# Altium footprint library Connector_art.PcbLib: 209 footprints (part 2 of 14)
Each footprint in its own frame and in the unit in brackets; x right, y up, seen from the top. Pads: shape width x height; smd on the part's side, far side on the other; paste and mask are expansions set on the pad; w line width, h text height; cw(c..) or ccw(c..) is an arc to the next point about the centre after c.
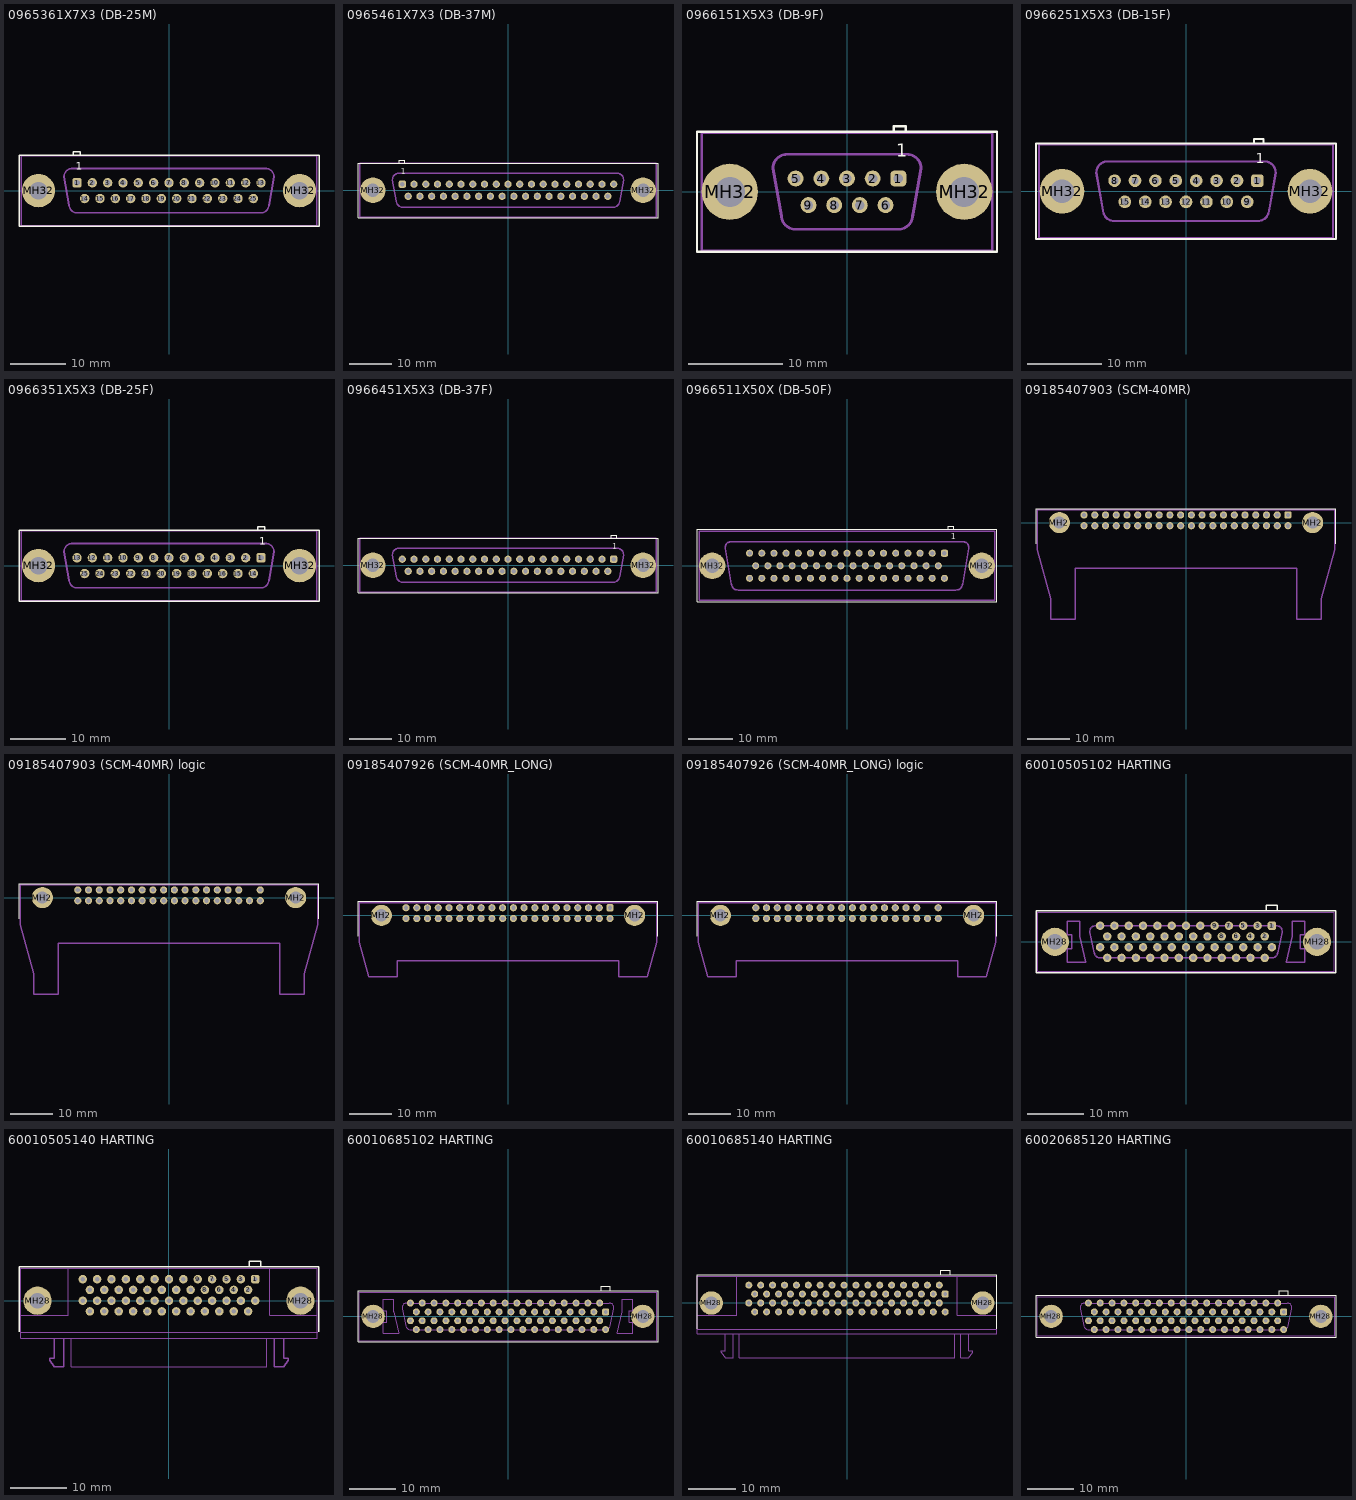
[diagram p1: the footprints below, top view; thin cyan lines are the x and y axes]

## 0965361X7X3 (DB-25M) [mm]
pads (27):
  rrect50% 1.7x1.7 hole 1: 1(-16.56,1.42)
  round 1.7 hole 1: 2(-13.8,1.42) 3(-11.04,1.42) 4(-8.28,1.42) 5(-5.52,1.42) 6(-2.76,1.42) 7(0,1.42) 8(2.76,1.42) 9(5.52,1.42) 10(8.28,1.42) 11(11.04,1.42) 12(13.8,1.42) 13(16.56,1.42) 14(-15.18,-1.42) 15(-12.42,-1.42) 16(-9.66,-1.42) 17(-6.9,-1.42) 18(-4.14,-1.42) 19(-1.38,-1.42) 20(1.38,-1.42) 21(4.14,-1.42) 22(6.9,-1.42) 23(9.66,-1.42) 24(12.42,-1.42) 25(15.18,-1.42)
  round 6 hole 3.2: MH32(-23.5,0) MH32(23.5,0)
Top Overlay:
  lines w0.25: -17.25,6.4 -17.25,7 -16,7 -16,6.4 ; -27,-6.4 -27,6.4 27,6.4 27,-6.4 -27,-6.4
  text "1" at -16.75,3.75 h1.38
Mechanical 1:
  circle w0.3: c-1.38,-1.42 r0.5
  circle w0.3: c1.38,-1.42 r0.5
  circle w0.3: c0,1.42 r0.5
  circle w0.3: c-23.5,0 r1.5
  circle w0.3: c23.5,0 r1.5
  circle w0.3: c4.14,-1.42 r0.5
  circle w0.3: c6.9,-1.42 r0.5
  circle w0.3: c9.66,-1.42 r0.5
  circle w0.3: c12.42,-1.42 r0.5
  circle w0.3: c15.18,-1.42 r0.5
  circle w0.3: c-4.14,-1.42 r0.5
  circle w0.3: c-6.9,-1.42 r0.5
  circle w0.3: c-9.66,-1.42 r0.5
  circle w0.3: c-12.42,-1.42 r0.5
  circle w0.3: c-15.18,-1.42 r0.5
  circle w0.3: c2.76,1.42 r0.5
  circle w0.3: c5.52,1.42 r0.5
  circle w0.3: c8.28,1.42 r0.5
  circle w0.3: c11.04,1.42 r0.5
  circle w0.3: c13.8,1.42 r0.5
  circle w0.3: c16.56,1.42 r0.5
  circle w0.3: c-2.76,1.42 r0.5
  circle w0.3: c-5.52,1.42 r0.5
  circle w0.3: c-8.28,1.42 r0.5
  circle w0.3: c-11.04,1.42 r0.5
  circle w0.3: c-13.8,1.42 r0.5
  circle w0.3: c-16.56,1.42 r0.5
  lines w0.1: -26,0 -21,0 ; -23.5,-2.5 -23.5,2.5 ; 21,0 26,0 ; 23.5,-2.5 23.5,2.5
  lines w0.3: -18,-2.6 -18.9,2.5 cw(c-17.4,2.5) -17.4,4 17.4,4 cw(c17.4,2.5) 18.9,2.5 18,-2.7 ; -18,-2.5 ccw(c-16.5,-2.5) -16.5,-4 16.5,-4 ccw(c16.5,-2.5) 18,-2.5 ; -26.6,-6.3 -26.6,6.3 26.6,6.3 26.6,-6.3 -26.6,-6.3
  text "13" at 16.75,2.25 h2.12
  text "1" at -18.25,2 h2.12
  text "25" at 15.75,-3.25 h2.12
  text "14" at -17.25,-3.25 h2.12

## 0965461X7X3 (DB-37M) [mm]
pads (39):
  rrect50% 1.7x1.7 hole 1: 1(-24.84,1.42)
  round 1.7 hole 1: 2(-22.08,1.42) 3(-19.32,1.42) 4(-16.56,1.42) 5(-13.8,1.42) 6(-11.04,1.42) 7(-8.28,1.42) 8(-5.52,1.42) 9(-2.76,1.42) 10(0,1.42) 11(2.76,1.42) 12(5.52,1.42) 13(8.28,1.42) 14(11.04,1.42) 15(13.8,1.42) 16(16.56,1.42) 17(19.32,1.42) 18(22.08,1.42) 19(24.84,1.42) 20(-23.46,-1.42) 21(-20.7,-1.42) 22(-17.94,-1.42) 23(-15.18,-1.42) 24(-12.42,-1.42) 25(-9.66,-1.42) 26(-6.9,-1.42) 27(-4.14,-1.42) 28(-1.38,-1.42) 29(1.38,-1.42) 30(4.14,-1.42) 31(6.9,-1.42) 32(9.66,-1.42) 33(12.42,-1.42) 34(15.18,-1.42) 35(17.94,-1.42) 36(20.7,-1.42) 37(23.46,-1.42)
  round 6 hole 3.2: MH32(-31.75,0) MH32(31.75,0)
Top Overlay:
  lines w0.25: -25.5,6.4 -25.5,7 -24.25,7 -24.25,6.4 ; -35.25,-6.4 -35.25,6.4 35.25,6.4 35.25,-6.4 -35.25,-6.4
  text "1" at -25.25,3.75 h1.38
Mechanical 1:
  circle w0.3: c-24.84,1.42 r0.5
  circle w0.3: c-22.08,1.42 r0.5
  circle w0.3: c-19.32,1.42 r0.5
  circle w0.3: c-16.56,1.42 r0.5
  circle w0.3: c-13.8,1.42 r0.5
  circle w0.3: c-11.04,1.42 r0.5
  circle w0.3: c-8.28,1.42 r0.5
  circle w0.3: c-5.52,1.42 r0.5
  circle w0.3: c-2.76,1.42 r0.5
  circle w0.3: c24.84,1.42 r0.5
  circle w0.3: c22.08,1.42 r0.5
  circle w0.3: c19.32,1.42 r0.5
  circle w0.3: c16.56,1.42 r0.5
  circle w0.3: c13.8,1.42 r0.5
  circle w0.3: c11.04,1.42 r0.5
  circle w0.3: c8.28,1.42 r0.5
  circle w0.3: c5.52,1.42 r0.5
  circle w0.3: c2.76,1.42 r0.5
  circle w0.3: c-23.46,-1.42 r0.5
  circle w0.3: c-20.7,-1.42 r0.5
  circle w0.3: c-17.94,-1.42 r0.5
  circle w0.3: c-15.18,-1.42 r0.5
  circle w0.3: c-12.42,-1.42 r0.5
  circle w0.3: c-9.66,-1.42 r0.5
  circle w0.3: c-6.9,-1.42 r0.5
  circle w0.3: c-4.14,-1.42 r0.5
  circle w0.3: c23.46,-1.42 r0.5
  circle w0.3: c20.7,-1.42 r0.5
  circle w0.3: c17.94,-1.42 r0.5
  circle w0.3: c15.18,-1.42 r0.5
  circle w0.3: c12.42,-1.42 r0.5
  circle w0.3: c9.66,-1.42 r0.5
  circle w0.3: c6.9,-1.42 r0.5
  circle w0.3: c4.14,-1.42 r0.5
  circle w0.3: c-1.38,-1.42 r0.5
  circle w0.3: c1.38,-1.42 r0.5
  circle w0.3: c0,1.42 r0.5
  circle w0.3: c-31.75,0 r1.5
  circle w0.3: c31.75,0 r1.5
  lines w0.1: -34.25,0 -29.25,0 ; -31.75,-2.5 -31.75,2.5 ; 29.25,0 34.25,0 ; 31.75,-2.5 31.75,2.5
  lines w0.3: -26.25,-2.6 -27.15,2.5 cw(c-25.65,2.5) -25.65,4 25.65,4 cw(c25.65,2.5) 27.15,2.5 26.25,-2.7 ; -26.25,-2.5 ccw(c-24.75,-2.5) -24.75,-4 24.75,-4 ccw(c24.75,-2.5) 26.25,-2.5 ; -34.85,-6.3 -34.85,6.3 34.85,6.3 34.85,-6.3 -34.85,-6.3
  text "19" at 25,2.25 h2.12
  text "1" at -26.25,2 h2.12
  text "37" at 24.25,-3.25 h2.12
  text "20" at -25.5,-3.25 h2.12

## 0966151X5X3 (DB-9F) [mm]
pads (11):
  rrect50% 1.7x1.7 hole 1: 1(5.48,1.42)
  round 1.7 hole 1: 2(2.74,1.42) 3(0,1.42) 4(-2.74,1.42) 5(-5.48,1.42) 6(4.11,-1.42) 7(1.37,-1.42) 8(-1.37,-1.42) 9(-4.11,-1.42)
  round 6 hole 3.2: MH32(-12.5,0) MH32(12.5,0)
Top Overlay:
  lines w0.25: 5,6.4 5,7 6.25,7 6.25,6.4 ; -16,-6.4 -16,6.4 16,6.4 16,-6.4 -16,-6.4
  text "1" at 5.25,3.75 h1.38
Mechanical 1:
  circle w0.3: c-5.48,1.42 r0.5
  circle w0.3: c-4.11,-1.42 r0.5
  circle w0.3: c-1.37,-1.42 r0.5
  circle w0.3: c-2.74,1.42 r0.5
  circle w0.3: c5.48,1.42 r0.5
  circle w0.3: c4.11,-1.42 r0.5
  circle w0.3: c2.74,1.42 r0.5
  circle w0.3: c1.37,-1.42 r0.5
  circle w0.3: c0,1.42 r0.5
  circle w0.3: c-12.5,0 r1.5
  circle w0.3: c12.5,0 r1.5
  lines w0.1: -15,0 -10,0 ; -12.5,-2.5 -12.5,2.5 ; 10,0 15,0 ; 12.5,-2.5 12.5,2.5
  lines w0.3: -7,-2.6 -7.9,2.5 cw(c-6.4,2.5) -6.4,4 6.4,4 cw(c6.4,2.5) 7.9,2.5 7,-2.7 ; -7,-2.5 ccw(c-5.5,-2.5) -5.5,-4 5.5,-4 ccw(c5.5,-2.5) 7,-2.5 ; -15.5,-6.3 -15.5,6.3 15.5,6.3 15.5,-6.3 -15.5,-6.3
  text "5" at -7.25,2 h2.12
  text "1" at 6.5,2 h2.12
  text "9" at -6.25,-3 h2.12
  text "6" at 5.25,-3 h2.12

## 0966251X5X3 (DB-15F) [mm]
pads (17):
  rrect50% 1.7x1.7 hole 1: 1(9.59,1.42)
  round 1.7 hole 1: 2(6.85,1.42) 3(4.11,1.42) 4(1.37,1.42) 5(-1.37,1.42) 6(-4.11,1.42) 7(-6.85,1.42) 8(-9.59,1.42) 9(8.22,-1.42) 10(5.48,-1.42) 11(2.74,-1.42) 12(0,-1.42) 13(-2.74,-1.42) 14(-5.48,-1.42) 15(-8.22,-1.42)
  round 6 hole 3.2: MH32(-16.65,0) MH32(16.65,0)
Top Overlay:
  lines w0.25: 9.15,6.4 9.15,7 10.4,7 10.4,6.4 ; -20.15,-6.4 -20.15,6.4 20.15,6.4 20.15,-6.4 -20.15,-6.4
  text "1" at 9.4,3.75 h1.38
Mechanical 1:
  circle w0.3: c-1.37,1.42 r0.5
  circle w0.3: c1.37,1.42 r0.5
  circle w0.3: c0,-1.42 r0.5
  circle w0.3: c-16.65,0 r1.5
  circle w0.3: c16.65,0 r1.5
  circle w0.3: c4.11,1.42 r0.5
  circle w0.3: c6.85,1.42 r0.5
  circle w0.3: c9.59,1.42 r0.5
  circle w0.3: c-4.11,1.42 r0.5
  circle w0.3: c-6.85,1.42 r0.5
  circle w0.3: c-9.59,1.42 r0.5
  circle w0.3: c2.74,-1.42 r0.5
  circle w0.3: c5.48,-1.42 r0.5
  circle w0.3: c8.22,-1.42 r0.5
  circle w0.3: c-2.74,-1.42 r0.5
  circle w0.3: c-5.48,-1.42 r0.5
  circle w0.3: c-8.22,-1.42 r0.5
  lines w0.1: -19.15,0 -14.15,0 ; -16.65,-2.5 -16.65,2.5 ; 14.15,0 19.15,0 ; 16.65,-2.5 16.65,2.5
  lines w0.3: -11.15,-2.6 -12.05,2.5 cw(c-10.55,2.5) -10.55,4 10.55,4 cw(c10.55,2.5) 12.05,2.5 11.15,-2.7 ; -11.15,-2.5 ccw(c-9.65,-2.5) -9.65,-4 9.65,-4 ccw(c9.65,-2.5) 11.15,-2.5 ; -19.75,-6.3 -19.75,6.3 19.75,6.3 19.75,-6.3 -19.75,-6.3
  text "8" at -11.4,2 h2.12
  text "1" at 10.65,2 h2.12
  text "15" at -10.4,-3 h2.12
  text "9" at 9.4,-3 h2.12

## 0966351X5X3 (DB-25F) [mm]
pads (27):
  rrect50% 1.7x1.7 hole 1: 1(16.56,1.42)
  round 1.7 hole 1: 2(13.8,1.42) 3(11.04,1.42) 4(8.28,1.42) 5(5.52,1.42) 6(2.76,1.42) 7(0,1.42) 8(-2.76,1.42) 9(-5.52,1.42) 10(-8.28,1.42) 11(-11.04,1.42) 12(-13.8,1.42) 13(-16.56,1.42) 14(15.18,-1.42) 15(12.42,-1.42) 16(9.66,-1.42) 17(6.9,-1.42) 18(4.14,-1.42) 19(1.38,-1.42) 20(-1.38,-1.42) 21(-4.14,-1.42) 22(-6.9,-1.42) 23(-9.66,-1.42) 24(-12.42,-1.42) 25(-15.18,-1.42)
  round 6 hole 3.2: MH32(-23.5,0) MH32(23.5,0)
Top Overlay:
  lines w0.25: 16,6.4 16,7 17.25,7 17.25,6.4 ; -27,-6.4 -27,6.4 27,6.4 27,-6.4 -27,-6.4
  text "1" at 16.25,3.75 h1.38
Mechanical 1:
  circle w0.3: c-1.38,-1.42 r0.5
  circle w0.3: c1.38,-1.42 r0.5
  circle w0.3: c0,1.42 r0.5
  circle w0.3: c-23.5,0 r1.5
  circle w0.3: c23.5,0 r1.5
  circle w0.3: c4.14,-1.42 r0.5
  circle w0.3: c6.9,-1.42 r0.5
  circle w0.3: c9.66,-1.42 r0.5
  circle w0.3: c12.42,-1.42 r0.5
  circle w0.3: c15.18,-1.42 r0.5
  circle w0.3: c-4.14,-1.42 r0.5
  circle w0.3: c-6.9,-1.42 r0.5
  circle w0.3: c-9.66,-1.42 r0.5
  circle w0.3: c-12.42,-1.42 r0.5
  circle w0.3: c-15.18,-1.42 r0.5
  circle w0.3: c2.76,1.42 r0.5
  circle w0.3: c5.52,1.42 r0.5
  circle w0.3: c8.28,1.42 r0.5
  circle w0.3: c11.04,1.42 r0.5
  circle w0.3: c13.8,1.42 r0.5
  circle w0.3: c16.56,1.42 r0.5
  circle w0.3: c-2.76,1.42 r0.5
  circle w0.3: c-5.52,1.42 r0.5
  circle w0.3: c-8.28,1.42 r0.5
  circle w0.3: c-11.04,1.42 r0.5
  circle w0.3: c-13.8,1.42 r0.5
  circle w0.3: c-16.56,1.42 r0.5
  lines w0.1: -26,0 -21,0 ; -23.5,-2.5 -23.5,2.5 ; 21,0 26,0 ; 23.5,-2.5 23.5,2.5
  lines w0.3: -18,-2.6 -18.9,2.5 cw(c-17.4,2.5) -17.4,4 17.4,4 cw(c17.4,2.5) 18.9,2.5 18,-2.7 ; -18,-2.5 ccw(c-16.5,-2.5) -16.5,-4 16.5,-4 ccw(c16.5,-2.5) 18,-2.5 ; -26.6,-6.3 -26.6,6.3 26.6,6.3 26.6,-6.3 -26.6,-6.3
  text "13" at -18.25,2 h2.12
  text "1" at 17.5,2 h2.12
  text "25" at -17.25,-3 h2.12
  text "14" at 16,-3 h2.12

## 0966451X5X3 (DB-37F) [mm]
pads (39):
  rrect50% 1.7x1.7 hole 1: 1(24.84,1.42)
  round 1.7 hole 1: 2(22.08,1.42) 3(19.32,1.42) 4(16.56,1.42) 5(13.8,1.42) 6(11.04,1.42) 7(8.28,1.42) 8(5.52,1.42) 9(2.76,1.42) 10(0,1.42) 11(-2.76,1.42) 12(-5.52,1.42) 13(-8.28,1.42) 14(-11.04,1.42) 15(-13.8,1.42) 16(-16.56,1.42) 17(-19.32,1.42) 18(-22.08,1.42) 19(-24.84,1.42) 20(23.46,-1.42) 21(20.7,-1.42) 22(17.94,-1.42) 23(15.18,-1.42) 24(12.42,-1.42) 25(9.66,-1.42) 26(6.9,-1.42) 27(4.14,-1.42) 28(1.38,-1.42) 29(-1.38,-1.42) 30(-4.14,-1.42) 31(-6.9,-1.42) 32(-9.66,-1.42) 33(-12.42,-1.42) 34(-15.18,-1.42) 35(-17.94,-1.42) 36(-20.7,-1.42) 37(-23.46,-1.42)
  round 6 hole 3.2: MH32(-31.75,0) MH32(31.75,0)
Top Overlay:
  lines w0.25: 24.25,6.4 24.25,7 25.5,7 25.5,6.4 ; -35.25,-6.4 35.25,-6.4 35.25,6.4 -35.25,6.4 -35.25,-6.4
  text "1" at 24.5,3.75 h1.38
Mechanical 1:
  circle w0.3: c31.75,0 r1.5
  circle w0.3: c-31.75,0 r1.5
  circle w0.3: c0,1.42 r0.5
  circle w0.3: c1.38,-1.42 r0.5
  circle w0.3: c-1.38,-1.42 r0.5
  circle w0.3: c4.14,-1.42 r0.5
  circle w0.3: c6.9,-1.42 r0.5
  circle w0.3: c9.66,-1.42 r0.5
  circle w0.3: c12.42,-1.42 r0.5
  circle w0.3: c15.18,-1.42 r0.5
  circle w0.3: c17.94,-1.42 r0.5
  circle w0.3: c20.7,-1.42 r0.5
  circle w0.3: c23.46,-1.42 r0.5
  circle w0.3: c-4.14,-1.42 r0.5
  circle w0.3: c-6.9,-1.42 r0.5
  circle w0.3: c-9.66,-1.42 r0.5
  circle w0.3: c-12.42,-1.42 r0.5
  circle w0.3: c-15.18,-1.42 r0.5
  circle w0.3: c-17.94,-1.42 r0.5
  circle w0.3: c-20.7,-1.42 r0.5
  circle w0.3: c-23.46,-1.42 r0.5
  circle w0.3: c2.76,1.42 r0.5
  circle w0.3: c5.52,1.42 r0.5
  circle w0.3: c8.28,1.42 r0.5
  circle w0.3: c11.04,1.42 r0.5
  circle w0.3: c13.8,1.42 r0.5
  circle w0.3: c16.56,1.42 r0.5
  circle w0.3: c19.32,1.42 r0.5
  circle w0.3: c22.08,1.42 r0.5
  circle w0.3: c24.84,1.42 r0.5
  circle w0.3: c-2.76,1.42 r0.5
  circle w0.3: c-5.52,1.42 r0.5
  circle w0.3: c-8.28,1.42 r0.5
  circle w0.3: c-11.04,1.42 r0.5
  circle w0.3: c-13.8,1.42 r0.5
  circle w0.3: c-16.56,1.42 r0.5
  circle w0.3: c-19.32,1.42 r0.5
  circle w0.3: c-22.08,1.42 r0.5
  circle w0.3: c-24.84,1.42 r0.5
  lines w0.1: -34.25,0 -29.25,0 ; -31.75,-2.5 -31.75,2.5 ; 29.25,0 34.25,0 ; 31.75,-2.5 31.75,2.5
  lines w0.3: -26.25,-2.6 -27.15,2.5 cw(c-25.65,2.5) -25.65,4 25.65,4 cw(c25.65,2.5) 27.15,2.5 26.25,-2.7 ; -26.25,-2.5 ccw(c-24.75,-2.5) -24.75,-4 24.75,-4 ccw(c24.75,-2.5) 26.25,-2.5 ; -34.85,-6.3 34.85,-6.3 34.85,6.3 -34.85,6.3 -34.85,-6.3
  text "20" at 24.25,-3 h2.12
  text "37" at -25.5,-3 h2.12
  text "1" at 25.75,2 h2.12
  text "19" at -26.5,2 h2.12

## 0966511X50X (DB-50F) [mm]
pads (52):
  rrect50% 1.6x1.6 hole 1: 1(22.08,2.84)
  round 1.6 hole 1: 2(19.32,2.84) 3(16.56,2.84) 4(13.8,2.84) 5(11.04,2.84) 6(8.28,2.84) 7(5.52,2.84) 8(2.76,2.84) 9(0,2.84) 10(-2.76,2.84) 11(-5.52,2.84) 12(-8.28,2.84) 13(-11.04,2.84) 14(-13.8,2.84) 15(-16.56,2.84) 16(-19.32,2.84) 17(-22.08,2.84) 18(20.7,0) 19(17.94,0) 20(15.18,0) 21(12.42,0) 22(9.66,0) 23(6.9,0) 24(4.14,0) 25(1.38,0) 26(-1.38,0) 27(-4.14,0) 28(-6.9,0) 29(-9.66,0) 30(-12.42,0) 31(-15.18,0) 32(-17.94,0) 33(-20.7,0) 34(22.08,-2.84) 35(19.32,-2.84) 36(16.56,-2.84) 37(13.8,-2.84) 38(11.04,-2.84) 39(8.28,-2.84) 40(5.52,-2.84) 41(2.76,-2.84) 42(0,-2.84) 43(-2.76,-2.84) 44(-5.52,-2.84) 45(-8.28,-2.84) 46(-11.04,-2.84) 47(-13.8,-2.84) 48(-16.56,-2.84) 49(-19.32,-2.84) 50(-22.08,-2.84)
  round 6 hole 3.2: MH32(-30.55,0) MH32(30.55,0)
Top Overlay:
  lines w0.25: 23,8.3 23,9 24.25,9 24.25,8.3 ; -34,-8.2 34,-8.2 34,8.3 -34,8.3 -34,-8.2
  text "1" at 23.5,6 h1.38
Mechanical 1:
  circle w0.3: c-22.08,-2.84 r0.5
  circle w0.3: c-22.08,2.84 r0.5
  circle w0.3: c-19.32,-2.84 r0.5
  circle w0.3: c-19.32,2.84 r0.5
  circle w0.3: c-16.56,-2.84 r0.5
  circle w0.3: c-16.56,2.84 r0.5
  circle w0.3: c-13.8,-2.84 r0.5
  circle w0.3: c-13.8,2.84 r0.5
  circle w0.3: c-11.04,-2.84 r0.5
  circle w0.3: c-11.04,2.84 r0.5
  circle w0.3: c-8.28,-2.84 r0.5
  circle w0.3: c-8.28,2.84 r0.5
  circle w0.3: c-5.52,-2.84 r0.5
  circle w0.3: c-5.52,2.84 r0.5
  circle w0.3: c-2.76,-2.84 r0.5
  circle w0.3: c-2.76,2.84 r0.5
  circle w0.3: c22.08,-2.84 r0.5
  circle w0.3: c22.08,2.84 r0.5
  circle w0.3: c19.32,-2.84 r0.5
  circle w0.3: c19.32,2.84 r0.5
  circle w0.3: c16.56,-2.84 r0.5
  circle w0.3: c16.56,2.84 r0.5
  circle w0.3: c13.8,-2.84 r0.5
  circle w0.3: c13.8,2.84 r0.5
  circle w0.3: c11.04,-2.84 r0.5
  circle w0.3: c11.04,2.84 r0.5
  circle w0.3: c8.28,-2.84 r0.5
  circle w0.3: c8.28,2.84 r0.5
  circle w0.3: c5.52,-2.84 r0.5
  circle w0.3: c5.52,2.84 r0.5
  circle w0.3: c2.76,-2.84 r0.5
  circle w0.3: c2.76,2.84 r0.5
  circle w0.3: c-20.7,0 r0.5
  circle w0.3: c-17.94,0 r0.5
  circle w0.3: c-15.18,0 r0.5
  circle w0.3: c-12.42,0 r0.5
  circle w0.3: c-9.66,0 r0.5
  circle w0.3: c-6.9,0 r0.5
  circle w0.3: c-4.14,0 r0.5
  circle w0.3: c20.7,0 r0.5
  circle w0.3: c17.94,0 r0.5
  circle w0.3: c15.18,0 r0.5
  circle w0.3: c12.42,0 r0.5
  circle w0.3: c9.66,0 r0.5
  circle w0.3: c6.9,0 r0.5
  circle w0.3: c4.14,0 r0.5
  circle w0.3: c0,2.84 r0.5
  circle w0.3: c1.38,0 r0.5
  circle w0.3: c-1.38,0 r0.5
  circle w0.3: c0,-2.84 r0.5
  circle w0.3: c-30.55,0 r1.5
  circle w0.3: c30.55,0 r1.5
  lines w0.1: -33.05,0 -28.05,0 ; -30.55,-2.5 -30.55,2.5 ; 28.05,0 33.05,0 ; 30.55,-2.5 30.55,2.5
  lines w0.3: -26.2,-4.2 -27.65,4 cw(c-26.15,4) -26.15,5.5 ; -26.2,5.5 26.2,5.5 ; -26.193,-4.149 ccw(c-24.7,-4) -24.7,-5.5 24.7,-5.5 ccw(c24.7,-4) 26.193,-4.149 ; 26.15,5.5 cw(c26.15,4) 27.65,4 26.2,-4.2 ; -33.5,-7.8 33.5,-7.8 33.5,7.8 -33.5,7.8 -33.5,-7.8
  text "18" at 22.25,-0.5 h2.12
  text "33" at -24,-0.75 h2.12
  text "34" at 23.75,-3.5 h2.12
  text "50" at -25.5,-3.5 h2.12
  text "1" at 23.75,2.25 h2.12
  text "17" at -25.25,2.25 h2.12
3D body: height 12.4, standoff -3.2, extent -33.5,-7.7 33.5,7.7

## 09185407903 (SCM-40MR) [mm]
height 9
pads (42):
  rrect50% 1.7x1.7 hole 1: 1(24.13,1.8)
  round 1.7 hole 1: 2(24.13,-0.74) 3(21.59,1.8) 4(21.61,-0.74) 5(19.05,1.8) 6(19.05,-0.74) 7(16.51,1.8) 8(16.51,-0.74) 9(13.97,1.8) 10(13.97,-0.74) 11(11.43,1.8) 12(11.43,-0.74) 13(8.89,1.8) 14(8.89,-0.74) 15(6.35,1.8) 16(6.35,-0.74) 17(3.81,1.8) 18(3.81,-0.74) 19(1.27,1.8) 20(1.27,-0.74) 21(-1.27,1.8) 22(-1.25,-0.74) 23(-3.81,1.8) 24(-3.81,-0.74) 25(-6.35,1.8) 26(-6.35,-0.74) 27(-8.89,1.8) 28(-8.89,-0.74) 29(-11.43,1.8) 30(-11.43,-0.74) 31(-13.97,1.8) 32(-13.95,-0.74) 33(-16.51,1.8) 34(-16.51,-0.74) 35(-19.05,1.8) 36(-19.05,-0.74) 37(-21.59,1.8) 38(-21.59,-0.74) 39(-24.13,1.8) 40(-24.13,-0.74)
  round 5 hole 2.9: MH2(-29.97,0) MH2(29.97,0)
Top Overlay:
  lines w0.25: -35.5,-5 -35.5,3.3 35.5,3.3 35.5,-5
Mechanical 1:
  lines w0.3: -35.208,-6.392 -32.05,-17.97 -32.05,-22.9 -26.2,-22.9 -26.2,-10.8 26.2,-10.8 26.2,-22.9 32.05,-22.9 32.05,-17.97 35.2,-6.42 35.2,3 -35.2,3 -35.2,-6.4
3D body: height 8.5, standoff -3.2, extent -35.197,-22.9 35.203,2.85

## 09185407903 (SCM-40MR) logic [mm]
height 9
pads (37):
  round 1.7 hole 1: 3(21.59,1.8) 4(21.61,-0.74) 6(19.05,-0.74) 7(16.51,1.8) 8(16.51,-0.74) 9(13.97,1.8) 10(13.97,-0.74) 11(11.43,1.8) 12(11.43,-0.74) 13(8.89,1.8) 14(8.89,-0.74) 15(6.35,1.8) 16(6.35,-0.74) 17(3.81,1.8) 18(3.81,-0.74) 19(1.27,1.8) 20(1.27,-0.74) 21(-1.27,1.8) 22(-1.25,-0.74) 23(-3.81,1.8) 24(-3.81,-0.74) 25(-6.35,1.8) 26(-6.35,-0.74) 27(-8.89,1.8) 28(-8.89,-0.74) 29(-11.43,1.8) 30(-11.43,-0.74) 31(-13.97,1.8) 32(-13.95,-0.74) 33(-16.51,1.8) 34(-16.51,-0.74) 35(-19.05,1.8) 36(-19.05,-0.74) 37(-21.59,1.8) 38(-21.59,-0.74)
  round 5 hole 2.9: MH2(-29.97,0) MH2(29.97,0)
Top Overlay:
  lines w0.25: -35.5,-5 -35.5,3.3 35.5,3.3 35.5,-5
Mechanical 1:
  lines w0.3: -35.208,-6.392 -32.05,-17.97 -32.05,-22.9 -26.2,-22.9 -26.2,-10.8 26.2,-10.8 26.2,-22.9 32.05,-22.9 32.05,-17.97 35.2,-6.42 35.2,3 -35.2,3 -35.2,-6.4
3D body: height 8.5, standoff -3.2, extent -35.197,-22.9 35.203,2.85

## 09185407926 (SCM-40MR_LONG) [mm]
height 9
pads (42):
  rrect50% 1.7x1.7 hole 1: 1(24.13,1.8)
  round 1.7 hole 1: 2(24.13,-0.74) 3(21.59,1.8) 4(21.61,-0.74) 5(19.05,1.8) 6(19.05,-0.74) 7(16.51,1.8) 8(16.51,-0.74) 9(13.97,1.8) 10(13.97,-0.74) 11(11.43,1.8) 12(11.43,-0.74) 13(8.89,1.8) 14(8.89,-0.74) 15(6.35,1.8) 16(6.35,-0.74) 17(3.81,1.8) 18(3.81,-0.74) 19(1.27,1.8) 20(1.27,-0.74) 21(-1.27,1.8) 22(-1.25,-0.74) 23(-3.81,1.8) 24(-3.81,-0.74) 25(-6.35,1.8) 26(-6.35,-0.74) 27(-8.89,1.8) 28(-8.89,-0.74) 29(-11.43,1.8) 30(-11.43,-0.74) 31(-13.97,1.8) 32(-13.95,-0.74) 33(-16.51,1.8) 34(-16.51,-0.74) 35(-19.05,1.8) 36(-19.05,-0.74) 37(-21.59,1.8) 38(-21.59,-0.74) 39(-24.13,1.8) 40(-24.13,-0.74)
  round 5 hole 2.9: MH2(-29.97,0) MH2(29.97,0)
Top Overlay:
  lines w0.25: -35.5,-5 -35.5,3.3 35.5,3.3 35.5,-5
Mechanical 1:
  lines w0.3: -35.208,-6.392 -32.996,-14.5 -26.2,-14.5 -26.2,-10.8 26.2,-10.8 26.2,-14.5 33,-14.5 ; -35.2,-6.4 -35.2,3 35.2,3 35.2,-6.42 32.997,-14.499
3D body: height 20.5, standoff -3, extent -35.197,-14.45 35.203,2.85

## 09185407926 (SCM-40MR_LONG) logic [mm]
height 9
pads (37):
  round 1.7 hole 1: 3(21.59,1.8) 4(21.61,-0.74) 6(19.05,-0.74) 7(16.51,1.8) 8(16.51,-0.74) 9(13.97,1.8) 10(13.97,-0.74) 11(11.43,1.8) 12(11.43,-0.74) 13(8.89,1.8) 14(8.89,-0.74) 15(6.35,1.8) 16(6.35,-0.74) 17(3.81,1.8) 18(3.81,-0.74) 19(1.27,1.8) 20(1.27,-0.74) 21(-1.27,1.8) 22(-1.25,-0.74) 23(-3.81,1.8) 24(-3.81,-0.74) 25(-6.35,1.8) 26(-6.35,-0.74) 27(-8.89,1.8) 28(-8.89,-0.74) 29(-11.43,1.8) 30(-11.43,-0.74) 31(-13.97,1.8) 32(-13.95,-0.74) 33(-16.51,1.8) 34(-16.51,-0.74) 35(-19.05,1.8) 36(-19.05,-0.74) 37(-21.59,1.8) 38(-21.59,-0.74)
  round 5 hole 2.9: MH2(-29.97,0) MH2(29.97,0)
Top Overlay:
  lines w0.25: -35.5,-5 -35.5,3.3 35.5,3.3 35.5,-5
Mechanical 1:
  lines w0.3: -35.208,-6.392 -32.996,-14.5 -26.2,-14.5 -26.2,-10.8 26.2,-10.8 26.2,-14.5 33,-14.5 ; -35.2,-6.4 -35.2,3 35.2,3 35.2,-6.42 32.997,-14.499
3D body: height 20.5, standoff -3, extent -35.197,-14.45 35.203,2.85

## 60010505102 HARTING [mm]
pads (52):
  rrect50% 1.5x1.5 hole 0.8: 1(15.24,2.85)
  round 1.5 hole 0.8: 2(13.97,0.95) 3(12.7,2.85) 4(11.43,0.95) 5(10.16,2.85) 6(8.89,0.95) 7(7.62,2.85) 8(6.35,0.95) 9(5.08,2.85) 10(3.81,0.95) 11(2.54,2.85) 12(1.27,0.95) 13(0,2.85) 14(-1.27,0.95) 15(-2.54,2.85) 16(-3.81,0.95) 17(-5.08,2.85) 18(-6.35,0.95) 19(-7.62,2.85) 20(-8.89,0.95) 21(-10.16,2.85) 22(-11.43,0.95) 23(-12.7,2.85) 24(-13.97,0.95) 25(-15.24,2.85) 26(15.24,-0.95) 27(13.97,-2.85) 28(12.7,-0.95) 29(11.43,-2.85) 30(10.16,-0.95) 31(8.89,-2.85) 32(7.62,-0.95) 33(6.35,-2.85) 34(5.08,-0.95) 35(3.81,-2.85) 36(2.54,-0.95) 37(1.27,-2.85) 38(0,-0.95) 39(-1.27,-2.85) 40(-2.54,-0.95) 41(-3.81,-2.85) 42(-5.08,-0.95) 43(-6.35,-2.85) 44(-7.62,-0.95) 45(-8.89,-2.85) 46(-10.16,-0.95) 47(-11.43,-2.85) 48(-12.7,-0.95) 49(-13.97,-2.85) 50(-15.24,-0.95)
  round 5 hole 2.8: MH28(-23.24,0) MH28(23.24,0)
Top Overlay:
  lines w0.25: 14.2,5.5 14.2,6.5 16.2,6.5 16.2,5.5 ; -26.6,-5.5 -26.6,5.5 26.6,5.5 26.6,-5.5 -26.6,-5.5
Mechanical 1:
  lines w0.2: -26.3,-5.2 -26.3,5.2 26.3,5.2 26.3,-5.2 -26.3,-5.2
  lines w0.25: -17.777,-3.667 -18.8,1 -18.8,3.65 -21.1,3.65 -21.1,1.25 -20.3,1.25 -20.3,-1.25 -21.1,-1.25 -21.1,-3.65 -17.777,-3.65 ; -17.042,1.675 -16.235,-2.005 ; -17.035,1.676 cw(c-16.05,1.85) -16.05,2.85 16.05,2.85 cw(c16.05,1.85) 17.035,1.676 ; -16.238,-2.006 ccw(c-15.25,-1.85) -15.25,-2.85 15.25,-2.85 ccw(c15.25,-1.85) 16.25,-1.85 ; 16.235,-2.008 17.042,1.675 ; 17.777,-3.667 18.8,1 18.8,3.65 21.1,3.65 21.1,1.25 20.3,1.25 20.3,-1.25 21.1,-1.25 21.1,-3.65 17.777,-3.65
3D body: height 9, standoff -3.3, extent -26.225,-5.25 26.225,5.25

## 60010505140 HARTING [mm]
pads (52):
  rrect50% 1.5x1.5 hole 0.8: 1(15.24,3.8)
  round 1.5 hole 0.8: 2(13.97,1.9) 3(12.7,3.8) 4(11.43,1.9) 5(10.16,3.8) 6(8.89,1.9) 7(7.62,3.8) 8(6.35,1.9) 9(5.08,3.8) 10(3.81,1.9) 11(2.54,3.8) 12(1.27,1.9) 13(0,3.8) 14(-1.27,1.9) 15(-2.54,3.8) 16(-3.81,1.9) 17(-5.08,3.8) 18(-6.35,1.9) 19(-7.62,3.8) 20(-8.89,1.9) 21(-10.16,3.8) 22(-11.43,1.9) 23(-12.7,3.8) 24(-13.97,1.9) 25(-15.24,3.8) 26(15.24,0) 27(13.97,-1.9) 28(12.7,0) 29(11.43,-1.9) 30(10.16,0) 31(8.89,-1.9) 32(7.62,0) 33(6.35,-1.9) 34(5.08,0) 35(3.81,-1.9) 36(2.54,0) 37(1.27,-1.9) 38(0,0) 39(-1.27,-1.9) 40(-2.54,0) 41(-3.81,-1.9) 42(-5.08,0) 43(-6.35,-1.9) 44(-7.62,0) 45(-8.89,-1.9) 46(-10.16,0) 47(-11.43,-1.9) 48(-12.7,0) 49(-13.97,-1.9) 50(-15.24,0)
  round 5 hole 2.8: MH28(-23.225,0) MH28(23.225,0)
Top Overlay:
  lines w0.25: -26.5,-5.5 -26.5,6 26.5,6 26.5,-5.5 ; 14.2,6 14.2,7 16.2,7 16.2,6
Mechanical 1:
  lines w0.2: -26.25,-5.6 26.25,-5.6 ; -26.2,-2.6 -17.8,-2.6 -17.8,5.7 ; -17.3,-6.6 -17.3,-11.7 17.3,-11.7 17.3,-6.6 ; 17.8,5.7 17.8,-2.6 26.2,-2.6 ; -26.2,-6.6 -26.2,5.7 26.2,5.7 26.2,-6.6 -26.2,-6.6
  lines w0.25: -20.3,-6.6 -20.3,-10.2 -21.1,-10.2 -21.1,-10.5 -20.3,-11.7 -18.6,-11.7 -18.6,-6.6 ; 18.6,-6.6 18.6,-11.7 20.3,-11.7 21.1,-10.5 21.1,-10.2 20.3,-10.2 20.3,-6.6
3D body: height 9.62, standoff -3.4, extent -26.225,-11.71 26.225,5.69

## 60010685102 HARTING [mm]
pads (70):
  rrect50% 1.5x1.5 hole 0.8: 1(20.955,0.95)
  round 1.5 hole 0.8: 2(19.685,2.85) 3(18.415,0.95) 4(17.145,2.85) 5(15.875,0.95) 6(14.605,2.85) 7(13.335,0.95) 8(12.065,2.85) 9(10.795,0.95) 10(9.525,2.85) 11(8.255,0.95) 12(6.985,2.85) 13(5.715,0.95) 14(4.445,2.85) 15(3.175,0.95) 16(1.905,2.85) 17(0.635,0.95) 18(-0.635,2.85) 19(-1.905,0.95) 20(-3.175,2.85) 21(-4.445,0.95) 22(-5.715,2.85) 23(-6.985,0.95) 24(-8.255,2.85) 25(-9.525,0.95) 26(-10.795,2.85) 27(-12.065,0.95) 28(-13.335,2.85) 29(-14.605,0.95) 30(-15.875,2.85) 31(-17.145,0.95) 32(-18.415,2.85) 33(-19.685,0.95) 34(-20.955,2.85) 35(20.955,-2.85) 36(19.685,-0.95) 37(18.415,-2.85) 38(17.145,-0.95) 39(15.875,-2.85) 40(14.605,-0.95) 41(13.335,-2.85) 42(12.065,-0.95) 43(10.795,-2.85) 44(9.525,-0.95) 45(8.255,-2.85) 46(6.985,-0.95) 47(5.715,-2.85) 48(4.445,-0.95) 49(3.175,-2.85) 50(1.905,-0.95) 51(0.635,-2.85) 52(-0.635,-0.95) 53(-1.905,-2.85) 54(-3.175,-0.95) 55(-4.445,-2.85) 56(-5.715,-0.95) 57(-6.985,-2.85) 58(-8.255,-0.95) 59(-9.525,-2.85) 60(-10.795,-0.95) 61(-12.065,-2.85) 62(-13.335,-0.95) 63(-14.605,-2.85) 64(-15.875,-0.95) 65(-17.145,-2.85) 66(-18.415,-0.95) 67(-19.685,-2.85) 68(-20.955,-0.95)
  round 5 hole 2.8: MH28(-28.95,0) MH28(28.95,0)
Top Overlay:
  lines w0.25: 20,5.5 20,6.5 22,6.5 22,5.5 ; -32.2,-5.5 -32.2,5.5 32.2,5.5 32.2,-5.5 -32.2,-5.5
Mechanical 1:
  lines w0.2: -31.9,-5.2 -31.9,5.2 31.9,5.2 31.9,-5.2 -31.9,-5.2
  lines w0.25: -23.477,-3.667 -24.5,1 -24.5,3.65 -26.8,3.65 -26.8,1.25 -26,1.25 -26,-1.25 -26.8,-1.25 -26.8,-3.65 -23.477,-3.65 ; -22.742,1.675 -21.935,-2.005 ; -22.735,1.676 cw(c-21.75,1.85) -21.75,2.85 21.75,2.85 cw(c21.75,1.85) 22.735,1.676 ; -21.938,-2.006 ccw(c-20.95,-1.85) -20.95,-2.85 20.95,-2.85 ccw(c20.95,-1.85) 21.95,-1.85 ; 21.935,-2.008 22.742,1.675 ; 23.477,-3.667 24.5,1 24.5,3.65 26.8,3.65 26.8,1.25 26,1.25 26,-1.25 26.8,-1.25 26.8,-3.65 23.477,-3.65
3D body: height 9, standoff -3.3, extent -31.94,-5.25 31.94,5.25

## 60010685140 HARTING [mm]
pads (70):
  rrect50% 1.5x1.5 hole 0.8: 1(20.955,1.9)
  round 1.5 hole 0.8: 2(19.685,3.8) 3(18.415,1.9) 4(17.145,3.8) 5(15.875,1.9) 6(14.605,3.8) 7(13.335,1.9) 8(12.065,3.8) 9(10.795,1.9) 10(9.525,3.8) 11(8.255,1.9) 12(6.985,3.8) 13(5.715,1.9) 14(4.445,3.8) 15(3.175,1.9) 16(1.905,3.8) 17(0.635,1.9) 18(-0.635,3.8) 19(-1.905,1.9) 20(-3.175,3.8) 21(-4.445,1.9) 22(-5.715,3.8) 23(-6.985,1.9) 24(-8.255,3.8) 25(-9.525,1.9) 26(-10.795,3.8) 27(-12.065,1.9) 28(-13.335,3.8) 29(-14.605,1.9) 30(-15.875,3.8) 31(-17.145,1.9) 32(-18.415,3.8) 33(-19.685,1.9) 34(-20.955,3.8) 35(20.955,-1.9) 36(19.685,0) 37(18.415,-1.9) 38(17.145,0) 39(15.875,-1.9) 40(14.605,0) 41(13.335,-1.9) 42(12.065,0) 43(10.795,-1.9) 44(9.525,0) 45(8.255,-1.9) 46(6.985,0) 47(5.715,-1.9) 48(4.445,0) 49(3.175,-1.9) 50(1.905,0) 51(0.635,-1.9) 52(-0.635,0) 53(-1.905,-1.9) 54(-3.175,0) 55(-4.445,-1.9) 56(-5.715,0) 57(-6.985,-1.9) 58(-8.255,0) 59(-9.525,-1.9) 60(-10.795,0) 61(-12.065,-1.9) 62(-13.335,0) 63(-14.605,-1.9) 64(-15.875,0) 65(-17.145,-1.9) 66(-18.415,0) 67(-19.685,-1.9) 68(-20.955,0)
  round 5 hole 2.8: MH28(-28.95,0) MH28(28.95,0)
Top Overlay:
  lines w0.25: -32,-5.5 -32,6 32,6 32,-5.5 ; 20,6 20,7 22,7 22,6
Mechanical 1:
  lines w0.2: -31.9,-5.6 31.9,-5.6 ; -31.9,-2.6 -23.5,-2.6 -23.5,5.7 ; -23,-6.6 -23,-11.7 23,-11.7 23,-6.6 ; 23.5,5.7 23.5,-2.6 31.9,-2.6 ; -31.9,-6.6 -31.9,5.7 31.9,5.7 31.9,-6.6 -31.9,-6.6
  lines w0.25: -26,-6.6 -26,-10.2 -26.8,-10.2 -26.8,-10.5 -26,-11.7 -24.3,-11.7 -24.3,-6.6 ; 24.3,-6.6 24.3,-11.7 26,-11.7 26.8,-10.5 26.8,-10.2 26,-10.2 26,-6.6
3D body: height 9.62, standoff -3.4, extent -31.94,-11.71 31.94,5.69

## 60020685120 HARTING [mm]
pads (70):
  rrect50% 1.5x1.5 hole 0.8: 1(20.955,0.95)
  round 1.5 hole 0.8: 2(19.685,2.85) 3(18.415,0.95) 4(17.145,2.85) 5(15.875,0.95) 6(14.605,2.85) 7(13.335,0.95) 8(12.065,2.85) 9(10.795,0.95) 10(9.525,2.85) 11(8.255,0.95) 12(6.985,2.85) 13(5.715,0.95) 14(4.445,2.85) 15(3.175,0.95) 16(1.905,2.85) 17(0.635,0.95) 18(-0.635,2.85) 19(-1.905,0.95) 20(-3.175,2.85) 21(-4.445,0.95) 22(-5.715,2.85) 23(-6.985,0.95) 24(-8.255,2.85) 25(-9.525,0.95) 26(-10.795,2.85) 27(-12.065,0.95) 28(-13.335,2.85) 29(-14.605,0.95) 30(-15.875,2.85) 31(-17.145,0.95) 32(-18.415,2.85) 33(-19.685,0.95) 34(-20.955,2.85) 35(20.955,-2.85) 36(19.685,-0.95) 37(18.415,-2.85) 38(17.145,-0.95) 39(15.875,-2.85) 40(14.605,-0.95) 41(13.335,-2.85) 42(12.065,-0.95) 43(10.795,-2.85) 44(9.525,-0.95) 45(8.255,-2.85) 46(6.985,-0.95) 47(5.715,-2.85) 48(4.445,-0.95) 49(3.175,-2.85) 50(1.905,-0.95) 51(0.635,-2.85) 52(-0.635,-0.95) 53(-1.905,-2.85) 54(-3.175,-0.95) 55(-4.445,-2.85) 56(-5.715,-0.95) 57(-6.985,-2.85) 58(-8.255,-0.95) 59(-9.525,-2.85) 60(-10.795,-0.95) 61(-12.065,-2.85) 62(-13.335,-0.95) 63(-14.605,-2.85) 64(-15.875,-0.95) 65(-17.145,-2.85) 66(-18.415,-0.95) 67(-19.685,-2.85) 68(-20.955,-0.95)
  round 5 hole 2.8: MH28(-28.95,0) MH28(28.95,0)
Top Overlay:
  lines w0.25: 20,4.5 20,5.5 22,5.5 22,4.5 ; -32.2,-4.5 32.2,-4.5 32.2,4.5 -32.2,4.5 -32.2,-4.5
Mechanical 1:
  lines w0.2: -31.9,-4.2 31.9,-4.2 31.9,4.2 -31.9,4.2 -31.9,-4.2
  lines w0.25: -22.742,1.675 -21.935,-2.005 ; -22.735,1.676 cw(c-21.75,1.85) -21.75,2.85 21.75,2.85 cw(c21.75,1.85) 22.735,1.676 ; -21.938,-2.006 ccw(c-20.95,-1.85) -20.95,-2.85 20.95,-2.85 ccw(c20.95,-1.85) 21.95,-1.85 ; 21.935,-2.008 22.742,1.675
3D body: height 8.9, standoff -3.5, extent -31.94,-4.2 31.94,4.2